# Altium footprint library 电容.PcbLib: 180 footprints (part 7 of 12)
Each footprint in its own frame and in the unit in brackets; x right, y up, seen from the top. Pads: shape width x height; smd on the part's side, far side on the other; paste and mask are expansions set on the pad; w line width, h text height; cw(c..) or ccw(c..) is an arc to the next point about the centre after c.
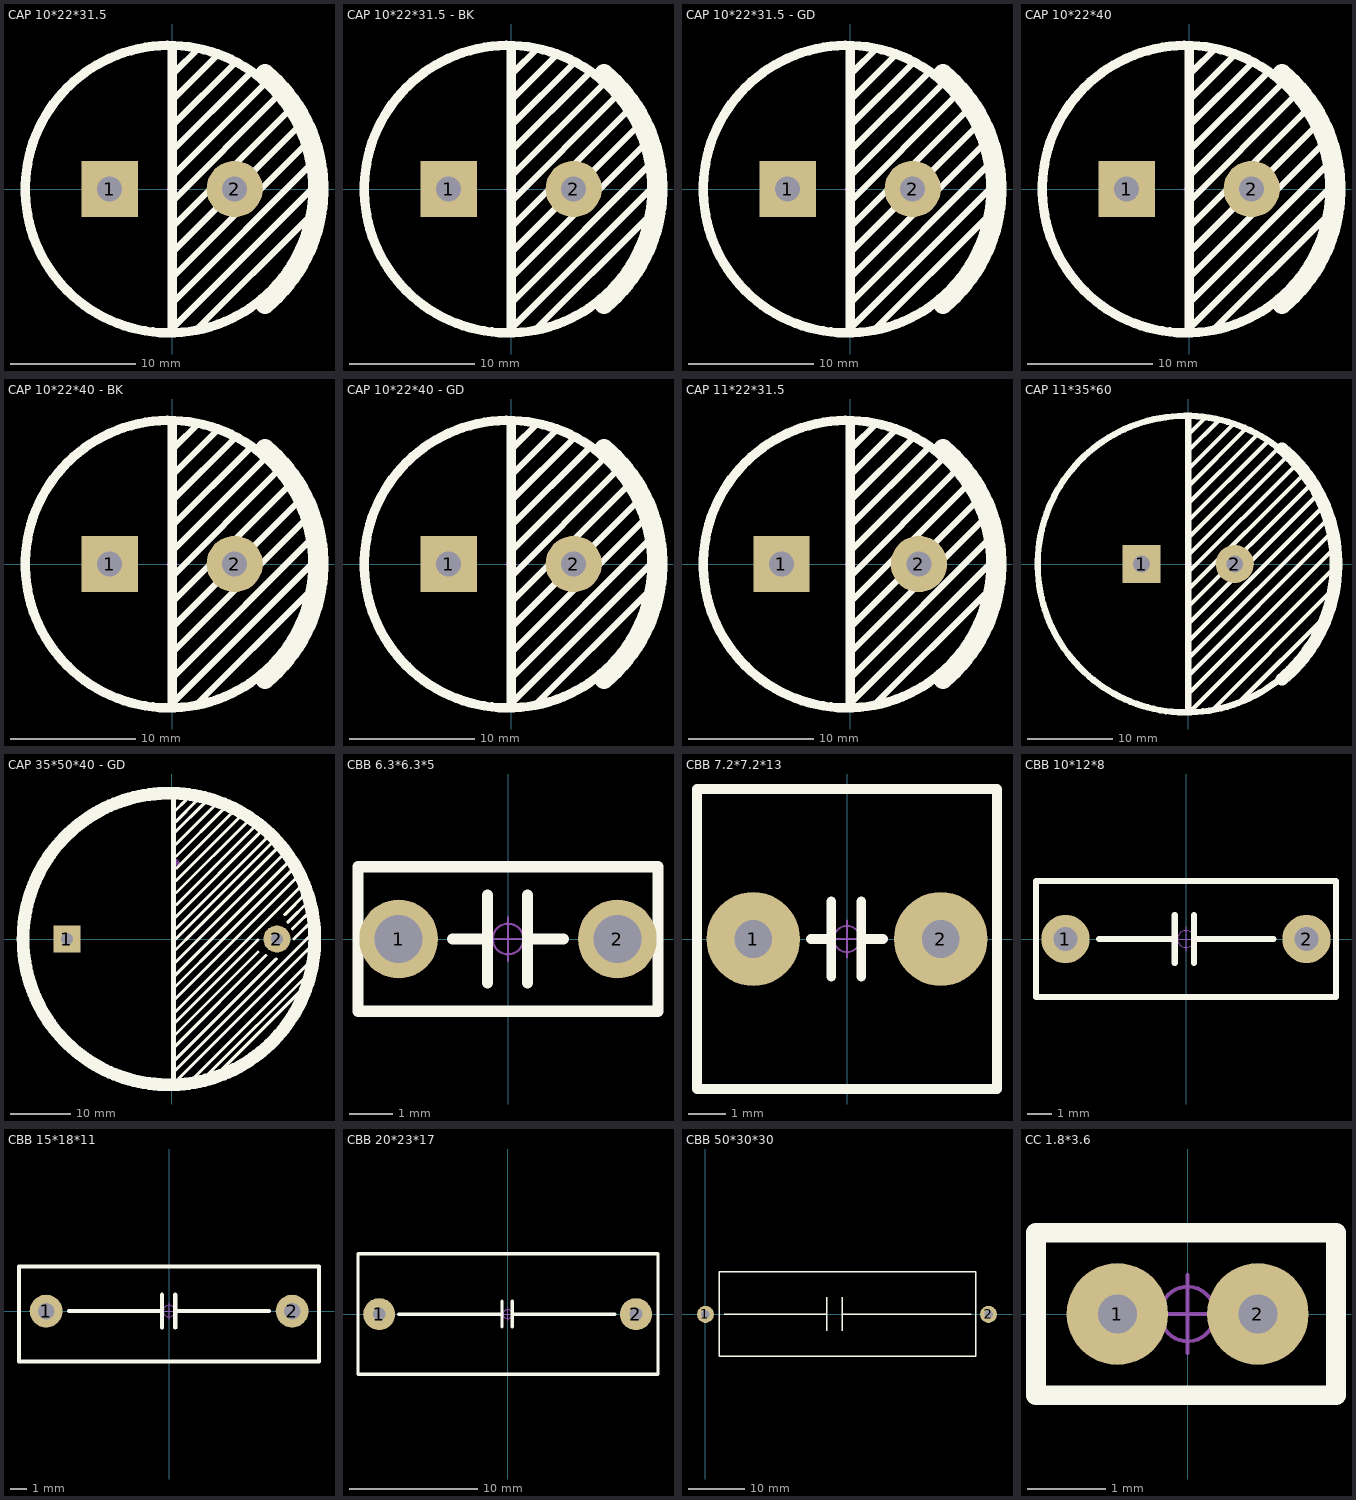
[diagram p6: the footprints below, top view; thin cyan lines are the x and y axes]

## CAP 10*22*31.5 [mm] "脚距10mm直径22mm高度31.5mm"
pads (2):
  rect 4.5x4.5 hole 2: 1(-5,0)
  round 4.5 hole 2: 2(5,0)
Top Overlay:
  circle w0.754: c-0.248,-0.013 r11.5
  lines w0.504: 0,-7.112 10.541,3.429 ; 0,-5.08 10.033,4.953 ; 0,-3.048 9.271,6.223 ; 0,-1.016 8.382,7.366 ; 0,1.016 7.493,8.509 ; 0,3.048 6.223,9.271 ; 0,5.08 4.953,10.033 ; 0,7.112 3.556,10.668 ; 0.254,-10.922 11.43,0.254 ; 0.254,-8.89 11.43,2.286 ; 0.254,9.398 2.032,11.176 ; 1.778,-11.43 11.049,-2.159
  lines w0.754: 0,-11.25 0,11.25
  lines w1.524: 7.428,-9.219 ccw(c-0.254,0) 7.428,9.219
Mechanical 15:
  circle w0.05: c0,0 r0.35
  lines w0.05: -0.5,0 0.5,0 ; 0,-0.5 0,0.5
3D body: height 31.53, standoff -3.38, extent -11,-10.997 11.01,10.997

## CAP 10*22*31.5 - BK [mm] "脚距10mm直径22mm高度31.5mm"
pads (2):
  rect 4.5x4.5 hole 2: 1(-5,0)
  round 4.5 hole 2: 2(5,0)
Top Overlay:
  circle w0.754: c-0.248,-0.013 r11.5
  lines w0.504: 0,-7.112 10.541,3.429 ; 0,-5.08 10.033,4.953 ; 0,-3.048 9.271,6.223 ; 0,-1.016 8.382,7.366 ; 0,1.016 7.493,8.509 ; 0,3.048 6.223,9.271 ; 0,5.08 4.953,10.033 ; 0,7.112 3.556,10.668 ; 0.254,-10.922 11.43,0.254 ; 0.254,-8.89 11.43,2.286 ; 0.254,9.398 2.032,11.176 ; 1.778,-11.43 11.049,-2.159
  lines w0.754: 0,-11.25 0,11.25
  lines w1.524: 7.428,-9.219 ccw(c-0.254,0) 7.428,9.219
Mechanical 15:
  circle w0.05: c0,0 r0.35
  lines w0.05: -0.5,0 0.5,0 ; 0,-0.5 0,0.5
3D body "CAP 10X22X31.5.STEP": height 31.54, standoff -3.37, extent -11,-10.997 11.01,10.997

## CAP 10*22*31.5 - GD [mm] "脚距10mm直径22mm高度31.5mm"
pads (2):
  rect 4.5x4.5 hole 2: 1(-5,0)
  round 4.5 hole 2: 2(5,0)
Top Overlay:
  circle w0.754: c-0.248,-0.013 r11.5
  lines w0.504: 0,-7.112 10.541,3.429 ; 0,-5.08 10.033,4.953 ; 0,-3.048 9.271,6.223 ; 0,-1.016 8.382,7.366 ; 0,1.016 7.493,8.509 ; 0,3.048 6.223,9.271 ; 0,5.08 4.953,10.033 ; 0,7.112 3.556,10.668 ; 0.254,-10.922 11.43,0.254 ; 0.254,-8.89 11.43,2.286 ; 0.254,9.398 2.032,11.176 ; 1.778,-11.43 11.049,-2.159
  lines w0.754: 0,-11.25 0,11.25
  lines w1.524: 7.428,-9.219 ccw(c-0.254,0) 7.428,9.219
Mechanical 15:
  circle w0.05: c0,0 r0.35
  lines w0.05: -0.5,0 0.5,0 ; 0,-0.5 0,0.5
3D body: height 31.54, standoff -3.37, extent -11,-10.997 11.01,10.997

## CAP 10*22*40 [mm] "脚距10mm直径22mm高度40mm"
pads (2):
  rect 4.5x4.5 hole 2: 1(-5,0)
  round 4.5 hole 2: 2(5,0)
Top Overlay:
  circle w0.754: c-0.248,-0.013 r11.5
  lines w0.504: 0,-7.112 10.541,3.429 ; 0,-5.08 10.033,4.953 ; 0,-3.048 9.271,6.223 ; 0,-1.016 8.382,7.366 ; 0,1.016 7.493,8.509 ; 0,3.048 6.223,9.271 ; 0,5.08 4.953,10.033 ; 0,7.112 3.556,10.668 ; 0.254,-10.922 11.43,0.254 ; 0.254,-8.89 11.43,2.286 ; 0.254,9.398 2.032,11.176 ; 1.778,-11.43 11.049,-2.159
  lines w0.754: 0,-11.25 0,11.25
  lines w1.524: 7.428,-9.219 ccw(c-0.254,0) 7.428,9.219
Mechanical 15:
  circle w0.05: c0,0 r0.35
  lines w0.05: -0.5,0 0.5,0 ; 0,-0.5 0,0.5
3D body: height 40.03, standoff -3.38, extent -11,-10.999 11.01,10.999

## CAP 10*22*40 - BK [mm] "脚距10mm直径22mm高度40mm"
pads (2):
  rect 4.5x4.5 hole 2: 1(-5,0)
  round 4.5 hole 2: 2(5,0)
Top Overlay:
  circle w0.754: c-0.248,-0.013 r11.5
  lines w0.504: 0,-7.112 10.541,3.429 ; 0,-5.08 10.033,4.953 ; 0,-3.048 9.271,6.223 ; 0,-1.016 8.382,7.366 ; 0,1.016 7.493,8.509 ; 0,3.048 6.223,9.271 ; 0,5.08 4.953,10.033 ; 0,7.112 3.556,10.668 ; 0.254,-10.922 11.43,0.254 ; 0.254,-8.89 11.43,2.286 ; 0.254,9.398 2.032,11.176 ; 1.778,-11.43 11.049,-2.159
  lines w0.754: 0,-11.25 0,11.25
  lines w1.524: 7.428,-9.219 ccw(c-0.254,0) 7.428,9.219
Mechanical 15:
  circle w0.05: c0,0 r0.35
  lines w0.05: -0.5,0 0.5,0 ; 0,-0.5 0,0.5
3D body "CAP 10X22X40.STEP": height 40.04, standoff -3.37, extent -11,-10.999 11.01,10.999

## CAP 10*22*40 - GD [mm] "脚距10mm直径22mm高度40mm"
pads (2):
  rect 4.5x4.5 hole 2: 1(-5,0)
  round 4.5 hole 2: 2(5,0)
Top Overlay:
  circle w0.754: c-0.248,-0.013 r11.5
  lines w0.504: 0,-7.112 10.541,3.429 ; 0,-5.08 10.033,4.953 ; 0,-3.048 9.271,6.223 ; 0,-1.016 8.382,7.366 ; 0,1.016 7.493,8.509 ; 0,3.048 6.223,9.271 ; 0,5.08 4.953,10.033 ; 0,7.112 3.556,10.668 ; 0.254,-10.922 11.43,0.254 ; 0.254,-8.89 11.43,2.286 ; 0.254,9.398 2.032,11.176 ; 1.778,-11.43 11.049,-2.159
  lines w0.754: 0,-11.25 0,11.25
  lines w1.524: 7.428,-9.219 ccw(c-0.254,0) 7.428,9.219
Mechanical 15:
  circle w0.05: c0,0 r0.35
  lines w0.05: -0.5,0 0.5,0 ; 0,-0.5 0,0.5
3D body: height 40.04, standoff -3.37, extent -11,-10.999 11.01,10.999

## CAP 11*22*31.5 [mm] "脚距11mm直径22mm高度31.5mm"
pads (2):
  rect 4.5x4.5 hole 2: 1(-5.5,0)
  round 4.5 hole 2: 2(5.5,0)
Top Overlay:
  circle w0.754: c-0.248,-0.013 r11.5
  lines w0.504: 0,-7.112 10.541,3.429 ; 0,-5.08 10.033,4.953 ; 0,-3.048 9.271,6.223 ; 0,-1.016 8.382,7.366 ; 0,1.016 7.493,8.509 ; 0,3.048 6.223,9.271 ; 0,5.08 4.953,10.033 ; 0,7.112 3.556,10.668 ; 0.254,-10.922 11.43,0.254 ; 0.254,-8.89 11.43,2.286 ; 0.254,9.398 2.032,11.176 ; 1.778,-11.43 11.049,-2.159
  lines w0.754: 0,-11.25 0,11.25
  lines w1.524: 7.428,-9.219 ccw(c-0.254,0) 7.428,9.219
Mechanical 15:
  circle w0.05: c0,0 r0.35
  lines w0.05: -0.5,0 0.5,0 ; 0,-0.5 0,0.5
3D body: height 31.53, standoff -3.38, extent -11,-10.997 11.01,10.997

## CAP 11*35*60 [mm] "脚距11mm直径35mm高度60mm"
pads (2):
  rect 4.5x4.5 hole 2: 1(-5.5,0)
  round 4.5 hole 2: 2(5.5,0)
Top Overlay:
  circle w0.754: c-0.248,-0.013 r17.5
  lines w0.504: -0.127,-15.494 16.954,1.587 ; -0.127,11.049 5.398,16.573 ; 0,-7.112 15.24,8.128 ; 0,-5.08 14.541,9.461 ; 0,-3.048 13.843,10.795 ; 0,-1.016 12.827,11.811 ; 0,1.016 11.62,12.636 ; 0,3.048 10.414,13.462 ; 0,5.08 9.335,14.414 ; 0,7.112 7.938,15.049 ; 0,13.335 3.556,16.891 3.937,16.891 ; 0,15.24 2.095,17.335 ; 0.127,-13.081 16.637,3.429 ; 0.254,-17.399 17.081,-0.572 ; 0.254,-10.922 16.192,5.016 ; 0.254,-8.89 16.002,6.858 ; 0.254,9.398 6.541,15.684 ; 2.857,-17.209 16.573,-3.492 ; 6.096,-16.256 16.129,-6.223 16.129,-5.715
  lines w0.754: 0,-17.145 0,17.145
  lines w1.524: 11.077,-13.597 ccw(c-0.254,0) 11.077,13.598
Mechanical 15:
  circle w0.05: c0,0 r0.35
  lines w0.05: -0.5,0 0.5,0 ; 0,-0.5 0,0.5
3D body: height 40.03, standoff -3.38, extent -17.907,-17.653 17.526,17.653

## CAP 35*50*40 - GD [mm] "脚距10mm直径22mm高度40mm"
pads (2):
  rect 4.5x4.5 hole 2: 1(-17.5,0)
  round 4.5 hole 2: 2(17.5,0)
Top Overlay:
  circle w1.524: c-0.508,0 r24
  circle w0.754: c-0.5,0 r25
  lines w0.504: 0.127,-6.477 15.875,9.271 ; 0.127,-4.318 15.875,11.43 ; 0.254,-22.225 16.002,-6.477 ; 0.254,-10.287 16.002,5.461 ; 0.254,-2.159 16.002,13.589 ; 0.381,-18.034 15.684,-2.73 ; 0.381,-14.097 14.351,-0.127 ; 0.381,-12.319 16.129,3.429 ; 0.381,-0.254 16.129,15.494 ; 0.508,-16.002 14.351,-2.159 ; 0.508,-8.001 16.256,7.747 ; 0.508,17.78 5.461,22.733 ; 0.508,21.336 2.286,23.114 ; 0.635,-20.066 17.399,-3.302 ; 0.635,3.683 14.986,18.034 ; 0.635,19.558 4.191,23.114 ; 0.762,1.778 16.51,17.526 ; 0.762,5.715 14.16,19.113 ; 0.762,7.747 12.827,19.812 ; 0.762,9.779 11.43,20.447 ; 0.762,11.811 10.16,21.209 ; 0.762,13.843 8.7,21.78 ; 0.762,15.875 6.985,22.098 ; 1.143,-23.241 16.891,-7.493 ; 1.651,1.016 17.399,16.764 ; 2.286,-0.127 18.034,15.621 ; 3.175,-23.622 18.923,-7.874 ; 3.429,-1.016 19.177,14.732 ; 4.572,-2.032 20.32,13.716 ; 4.699,-3.81 20.447,11.938 ; 5.588,-22.987 22.924,-5.651 ; 5.588,-4.953 21.336,10.795 ; 6.223,-23.876 21.971,-8.128 ; 6.35,-6.35 22.098,9.398 ; 8.382,-18.415 24.13,-2.667 ; 8.636,-13.843 24.384,1.905 ; 8.763,-15.621 24.511,0.127 ; 18.796,4.064 22.352,7.62 ; 19.304,2.794 22.86,6.35 ; 20.066,1.651 23.622,5.207 ; 20.32,0 23.876,3.556
  lines w0.754: 0.254,-24.966 0.254,24.638
Mechanical 15:
  circle w0.05: c0.762,12.827 r0.35
  lines w0.05: 0.262,12.827 1.262,12.827 ; 0.762,12.327 0.762,13.327

## CBB 6.3*6.3*5 [mm] "脚距5mm高6.3mm厚3mm"
pads (2):
  round 1.8 hole 1.1: 1(-2.5,0) 2(2.5,0)
Top Overlay:
  lines w0.254: -1.27,0 -0.555,0 ; -0.466,-1 -0.466,1 ; 0.445,-1 0.445,1 ; 0.461,0 1.27,0 ; -3.429,-1.651 -3.429,1.651 3.429,1.651 3.429,-1.651 -3.429,-1.651
Mechanical 15:
  circle w0.05: c0,0 r0.35
  lines w0.05: -0.5,0 0.5,0 ; 0,-0.5 0,0.5
3D body: height 6.8, standoff -3.5, extent -3.15,-1.5 3.15,1.5

## CBB 7.2*7.2*13 [mm] "脚距5mm高13mm厚7.2mm"
pads (2):
  round 2.5 hole 1: 1(-2.5,0) 2(2.5,0)
Top Overlay:
  lines w0.254: -0.96,0 -0.515,0 ; -0.426,-1 -0.426,1 ; 0.374,-1 0.374,1 ; 0.414,0 0.96,0 ; -4,-4 4,-4 4,4 -4,4 -4,-4
Mechanical 15:
  circle w0.05: c0,0 r0.35
  lines w0.05: -0.5,0 0.5,0 ; 0,-0.5 0,0.5
3D body: height 17.53, standoff -3.47, extent -4,-4 4,4

## CBB 10*12*8 [mm] "脚距10mm高12mm厚8mm"
pads (2):
  round 2 hole 1: 1(-5,0) 2(5,0)
Top Overlay:
  lines w0.254: -3.603,0 -0.555,0 ; -0.466,-1 -0.466,1 ; 0.334,-1 0.334,1 ; 0.461,0 3.636,0 ; -6.223,-2.413 6.223,-2.413 6.223,2.413 -6.223,2.413 -6.223,-2.413
Mechanical 15:
  circle w0.05: c0,0 r0.35
  lines w0.05: -0.5,0 0.5,0 ; 0,-0.5 0,0.5
3D body "CBB 10X12X8.STEP": height 8.53, standoff -3.47, extent -6,-2.25 6,2.25

## CBB 15*18*11 [mm] "脚距15mm高18mm厚11mm"
pads (2):
  round 2 hole 1: 1(-7.5,0) 2(7.5,0)
Top Overlay:
  lines w0.254: -6.103,0 -0.515,0 ; -0.426,-1 -0.426,1 ; 0.374,-1 0.374,1 ; 0.501,0 6.089,0 ; -9.151,-3.073 9.137,-3.073 9.137,2.718 -9.151,2.718 -9.151,-3.073
Mechanical 15:
  circle w0.05: c0,0 r0.35
  lines w0.05: -0.5,0 0.5,0 ; 0,-0.5 0,0.5
3D body: height 11.53, standoff -3.47, extent -9.007,-2.921 8.993,2.579

## CBB 20*23*17 [mm] "脚距20mm高23mm厚17mm"
pads (2):
  round 2.5 hole 1: 1(-10,0) 2(10,0)
Top Overlay:
  lines w0.254: -8.476,0 -0.515,0 ; -0.426,-1 -0.426,1 ; 0.374,-1 0.374,1 ; 0.414,0 8.375,0 ; -11.651,-4.674 11.717,-4.674 11.717,4.699 -11.651,4.699 -11.651,-4.674
Mechanical 15:
  circle w0.05: c0,0 r0.35
  lines w0.05: -0.5,0 0.5,0 ; 0,-0.5 0,0.5
3D body: height 17.53, standoff -3.47, extent -11.5,-4.5 11.5,4.5

## CBB 50*30*30 [mm] "大型耦合电容 脚距50mm 宽30mm"
height 30
pads (2):
  round 3 hole 1.5: 1(0,0) 2(50,0)
Top Overlay:
  lines w0.254: 3.302,0 21.463,0 ; 21.463,-2.921 21.463,3.048 ; 24.13,-2.921 24.13,3.048 ; 24.257,0 46.99,0 ; 2.413,-7.366 47.752,-7.366 47.752,7.493 2.413,7.493 2.413,-7.366
3D body: height 30.3, standoff -1, extent 2.413,-7.493 47.752,7.62

## CC 1.8*3.6 [mm] "脚距1.8mm直径3.6mm"
pads (2):
  round 1.3 hole 0.5: 1(-0.9,0) 2(0.9,0)
Top Overlay:
  lines w0.254: -1.941,-1.041 -1.941,1.041 1.9,1.041 1.9,-1.041 -1.941,-1.041
Mechanical 15:
  circle w0.05: c0,0 r0.35
  lines w0.05: -0.5,0 0.5,0 ; 0,-0.5 0,0.5
3D body: height 3.6, standoff -3.5, extent -1.8,-0.798 1.8,0.796